# Altium footprint library Herry.PcbLib: 58 footprints (part 3 of 4)
Each footprint in its own frame and in the unit in brackets; x right, y up, seen from the top. Pads: shape width x height; smd on the part's side, far side on the other; paste and mask are expansions set on the pad; w line width, h text height; cw(c..) or ccw(c..) is an arc to the next point about the centre after c.
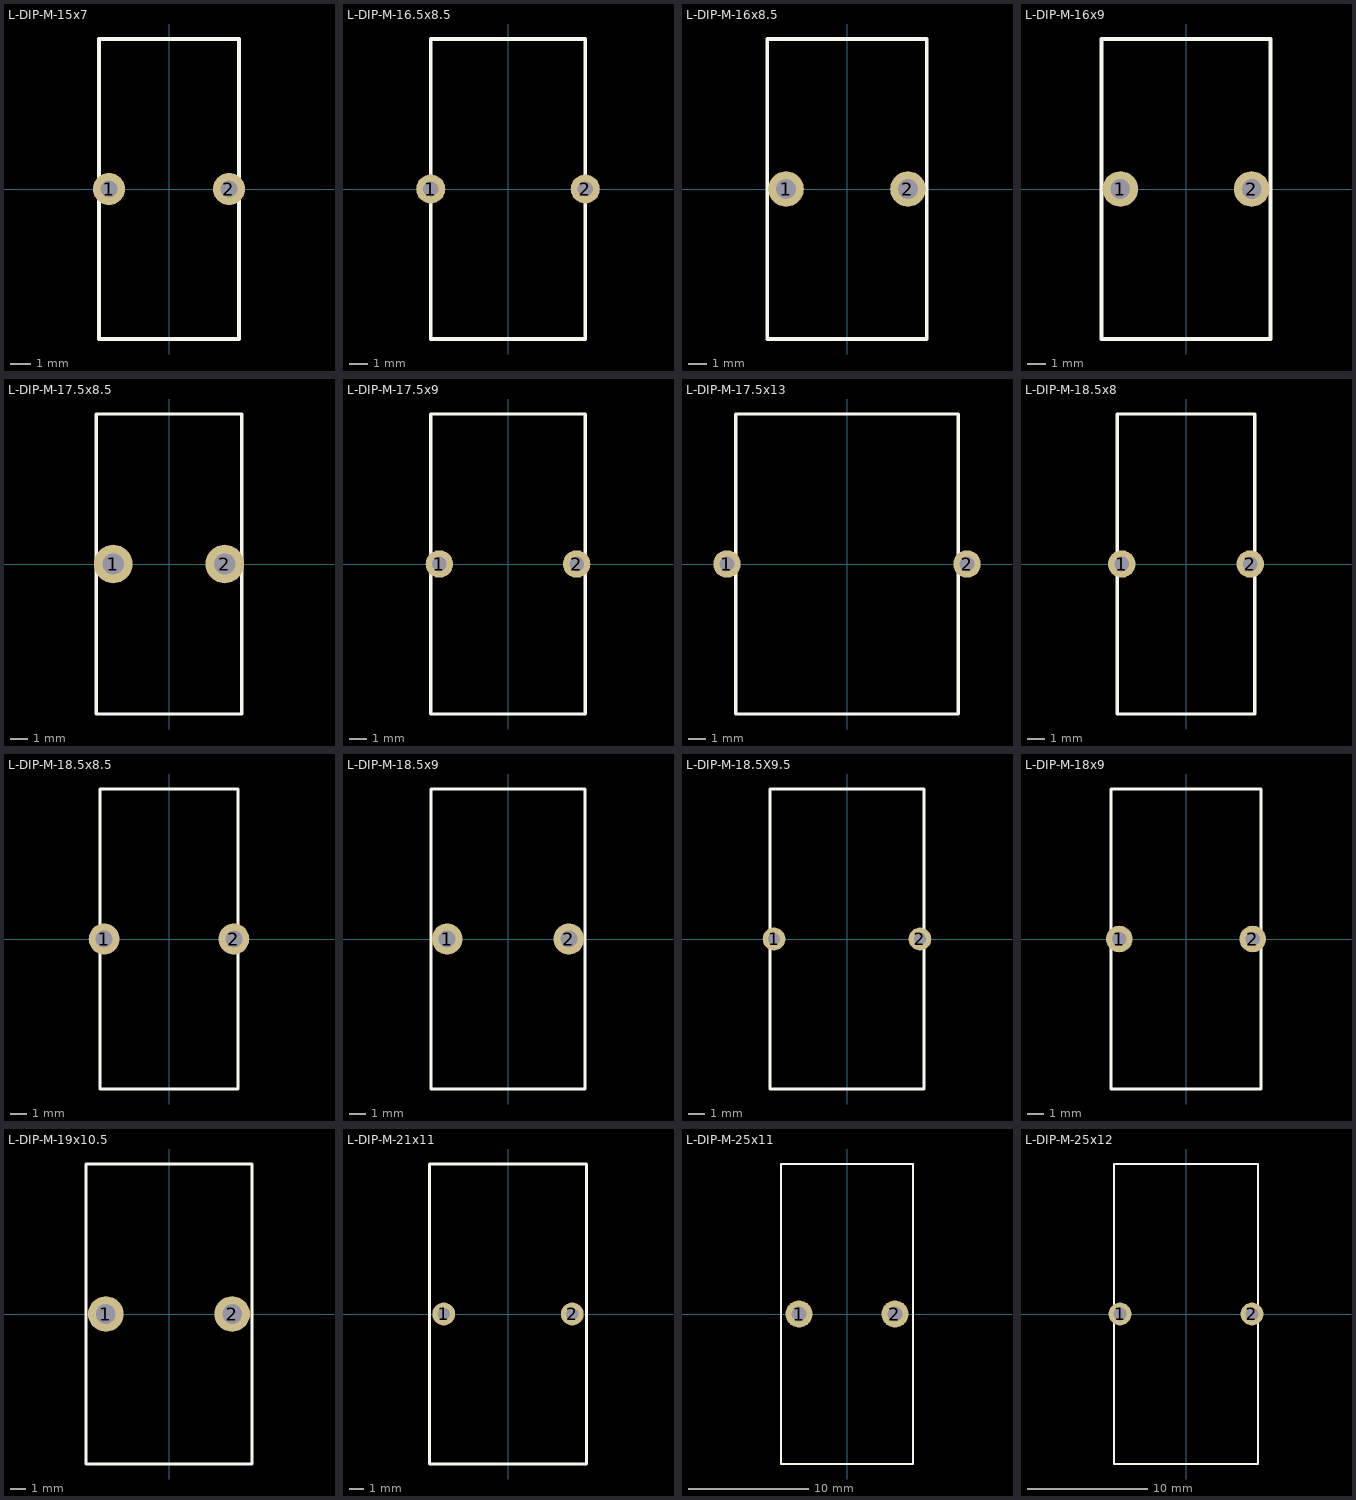
[diagram p2: the footprints below, top view; thin cyan lines are the x and y axes]

## L-DIP-M-15x7 [mm] "Body 15x7mm, 2 leads"
height 15
pads (2):
  round 1.6 hole 0.85: 1(-3,0) 2(3,0)
Top Overlay:
  lines w0.2: -3.5,-7.5 -3.5,7.5 3.5,7.5 3.5,-7.5 -3.5,-7.5
3D body "7447024.stp": height 16.59, standoff -14, extent -4.12,-8.113 4.12,8.113

## L-DIP-M-16.5x8.5 [mm] "Body 16.5x8.5mm, 2 leads"
height 16.5
pads (2):
  round 1.6 hole 0.85: 1(-4.25,0) 2(4.25,0)
Top Overlay:
  lines w0.2: -4.25,-8.25 4.25,-8.25 4.25,8.25 -4.25,8.25 -4.25,-8.25
3D body "7447018.stp": height 17.87, standoff -14.25, extent -4.87,-8.833 4.87,8.834

## L-DIP-M-16x8.5 [mm] "Body 16x8.5mm, 2 leads"
height 16
pads (2):
  round 1.9 hole 1.05: 1(-3.25,0) 2(3.25,0)
Top Overlay:
  lines w0.2: -4.25,-8 -4.25,8 4.25,8 4.25,-8 -4.25,-8
3D body "7447025.stp": height 18.28, standoff -13.5, extent -5.07,-8.81 5.07,8.807

## L-DIP-M-16x9 [mm] "Body 16x9mm, 2 leads"
height 16
pads (2):
  round 1.9 hole 1.05: 1(-3.5,0) 2(3.5,0)
Top Overlay:
  lines w0.2: -4.5,-8 4.5,-8 4.5,8 -4.5,8 -4.5,-8
3D body "7447023.stp": height 17.28, standoff -14.5, extent -5.32,-8.81 5.32,8.807

## L-DIP-M-17.5x8.5 [mm] "Body 17.5x8.5mm, 2 leads"
height 17.5
pads (2):
  round 2.25 hole 1.25: 1(-3.25,0) 2(3.25,0)
Top Overlay:
  lines w0.2: -4.25,-8.75 -4.25,8.75 4.25,8.75 4.25,-8.75 -4.25,-8.75
3D body "7447026.stp": height 19.18, standoff -6.75, extent -5.27,-9.748 5.27,9.747

## L-DIP-M-17.5x9 [mm] "Body 17.5x9mm, 2 leads"
height 17.5
pads (2):
  round 1.6 hole 0.85: 1(-4,0) 2(4,0)
Top Overlay:
  lines w0.2: -4.5,-8.75 -4.5,8.75 4.5,8.75 4.5,-8.75 -4.5,-8.75
3D body "7447011.stp": height 19.35, standoff -13.75, extent -5.12,-9.365 5.12,9.365

## L-DIP-M-17.5x13 [mm] "Body 17.5x13mm, 2 leads"
height 17.5
pads (2):
  round 1.6 hole 0.85: 1(-7,0) 2(7,0)
Top Overlay:
  lines w0.2: -6.5,-8.75 -6.5,8.75 6.5,8.75 6.5,-8.75 -6.5,-8.75
3D body "74470292.stp": height 18.85, standoff -19.25, extent -7.12,-9.365 7.12,9.365

## L-DIP-M-18.5x8 [mm] "Body 17.5x8mm, 2 leads"
height 17.5
pads (2):
  round 1.6 hole 0.85: 1(-3.75,0) 2(3.75,0)
Top Overlay:
  lines w0.2: -4,-8.75 4,-8.75 4,8.75 -4,8.75 -4,-8.75
3D body "7447014.stp": height 19.35, standoff -13.75, extent -4.62,-9.365 4.62,9.365

## L-DIP-M-18.5x8.5 [mm] "Body 18.5x8.5mm, 2 leads"
height 18.5
pads (2):
  round 1.9 hole 1.05: 1(-4,0) 2(4,0)
Top Overlay:
  lines w0.2: -4.25,-9.25 -4.25,9.25 4.25,9.25 4.25,-9.25 -4.25,-9.25
3D body "7447015.stp": height 20.02, standoff -14.25, extent -5.07,-10.059 5.07,10.058

## L-DIP-M-18.5x9 [mm] "Body 18.5x9.5mm, 2 leads"
height 18.5
pads (2):
  round 1.9 hole 1.05: 1(-3.75,0) 2(3.75,0)
Top Overlay:
  lines w0.2: -4.75,-9.25 4.75,-9.25 4.75,9.25 -4.75,9.25 -4.75,-9.25
3D body "7447013.stp": height 20.02, standoff -14.25, extent -5.57,-10.059 5.57,10.058

## L-DIP-M-18.5X9.5 [mm] "Body 18.5x9.5mm, 2 leads"
height 18.5
pads (2):
  round 1.4 hole 0.75: 1(-4.5,0) 2(4.5,0)
Top Overlay:
  lines w0.2: -4.75,-9.25 4.75,-9.25 4.75,9.25 -4.75,9.25 -4.75,-9.25
3D body "7447010.stp": height 19.9, standoff -14.25, extent -5.42,-9.915 5.42,9.916

## L-DIP-M-18x9 [mm] "Body 18x9mm, 2 leads"
height 18
pads (2):
  round 1.6 hole 0.85: 1(-4,0) 2(4,0)
Top Overlay:
  lines w0.2: -4.5,-9 -4.5,9 4.5,9 4.5,-9 -4.5,-9
3D body "7447012.stp": height 19.6, standoff -14, extent -5.12,-9.614 5.12,9.614

## L-DIP-M-19x10.5 [mm] "Body 19x10.5mm, 2 leads"
height 19
pads (2):
  round 2.25 hole 1.25: 1(-4,0) 2(4,0)
Top Overlay:
  lines w0.2: -5.25,-9.5 -5.25,9.5 5.25,9.5 5.25,-9.5 -5.25,-9.5
3D body "7447016.stp": height 17.32, standoff -14.3, extent -4.27,-8.693 4.27,8.694

## L-DIP-M-21x11 [mm] "Body 21x11mm, 2 leads"
height 21
pads (2):
  round 1.6 hole 0.85: 1(-4.5,0) 2(4.5,0)
Top Overlay:
  lines w0.2: -5.5,-10.5 -5.5,10.5 5.5,10.5 5.5,-10.5 -5.5,-10.5
3D body "7447060.stp": height 23.1, standoff -23.5, extent -6.12,-11.114 6.12,11.115

## L-DIP-M-25x11 [mm] "Body 25x11mm, 2 leads"
height 25
pads (2):
  round 2.25 hole 1.25: 1(-4,0) 2(4,0)
Top Overlay:
  lines w0.2: -5.5,-12.5 5.5,-12.5 5.5,12.5 -5.5,12.5 -5.5,-12.5
3D body "7447070.stp": height 27.48, standoff -13.5, extent -6.52,-13.508 6.52,13.509

## L-DIP-M-25x12 [mm] "Body 25x12mm, 2 leads"
height 25
pads (2):
  round 1.9 hole 1.05: 1(-5.5,0) 2(5.5,0)
Top Overlay:
  lines w0.2: -6,-12.5 6,-12.5 6,12.5 -6,12.5 -6,-12.5
3D body "7447071.stp": height 27.3, standoff -23.5, extent -6.82,-13.312 6.82,13.312